# Altium footprint library connector.PcbLib: 39 footprints (part 1 of 3)
Each footprint in its own frame and in the unit in brackets; x right, y up, seen from the top. Pads: shape width x height; smd on the part's side, far side on the other; paste and mask are expansions set on the pad; w line width, h text height; cw(c..) or ccw(c..) is an arc to the next point about the centre after c.
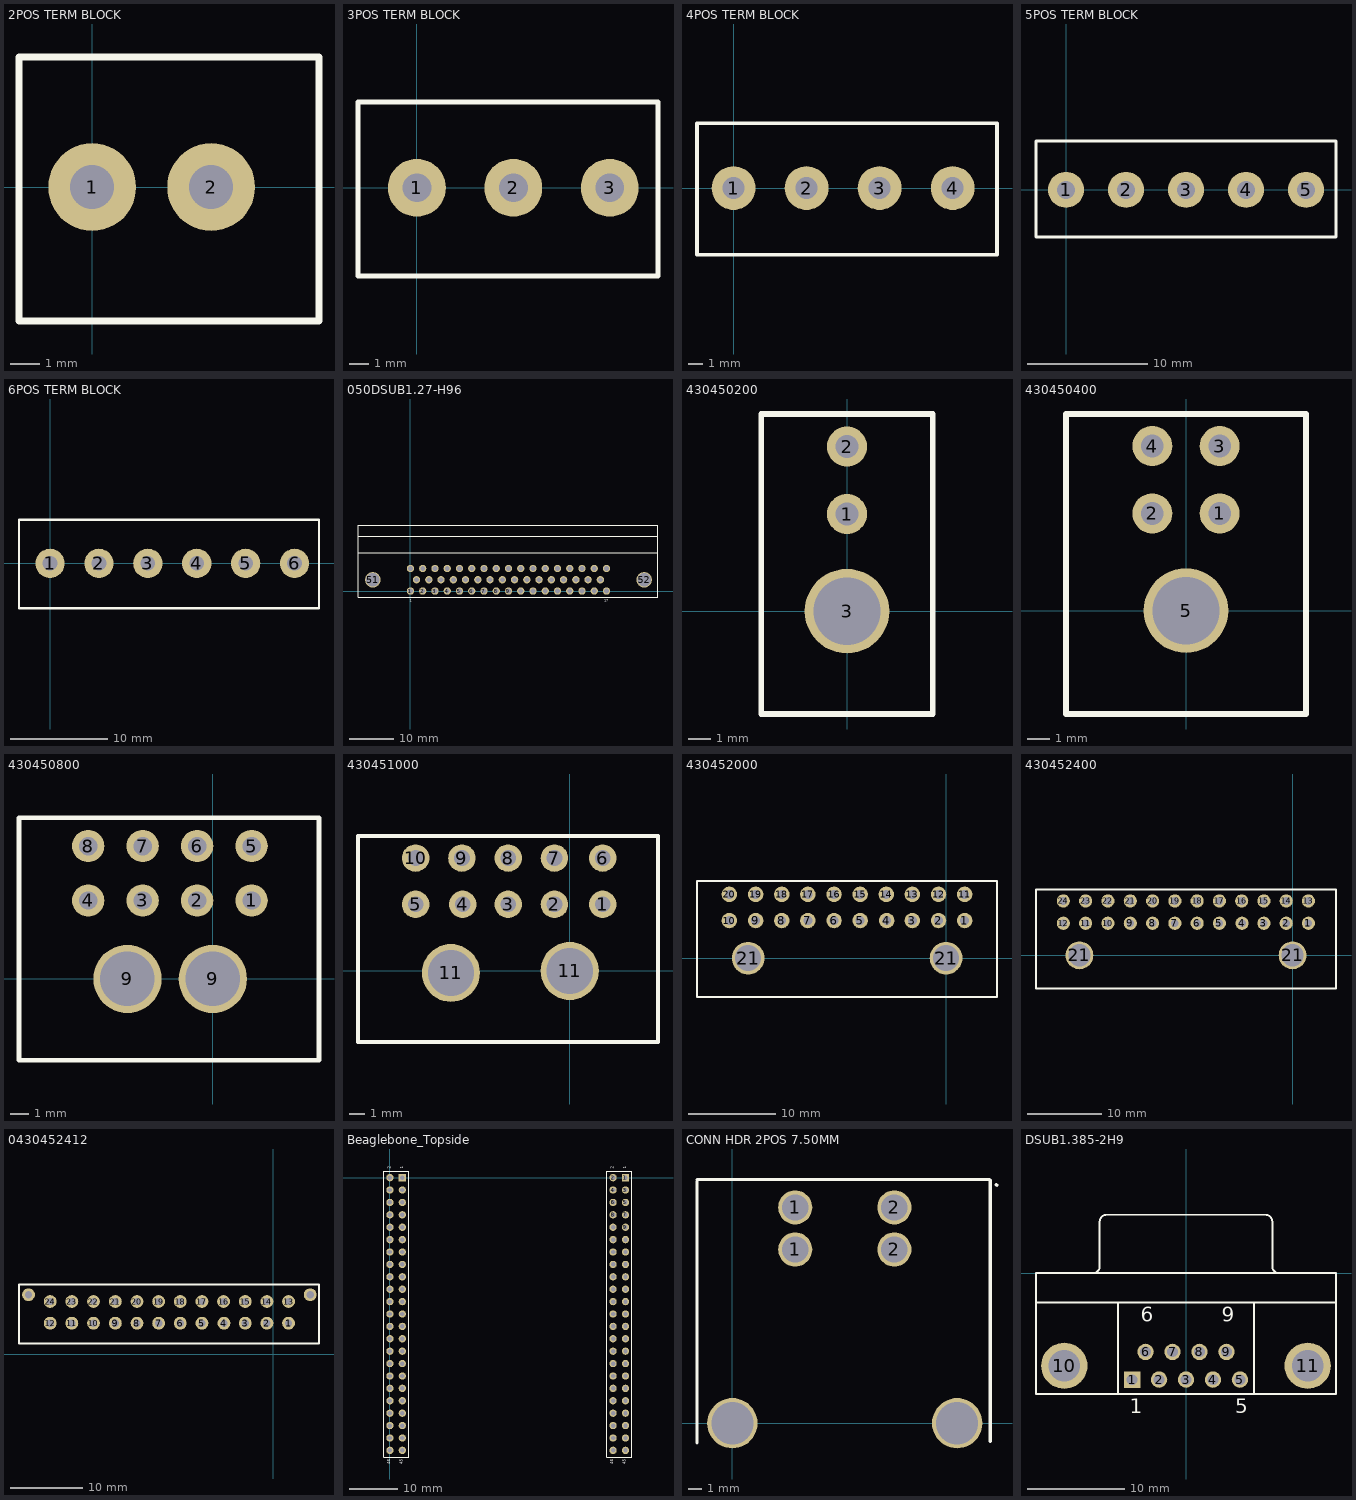
[diagram p0: the footprints below, top view; thin cyan lines are the x and y axes]

## 2POS TERM BLOCK [mm] "5mm Pitch"
height 11.3
pads (2):
  round 3 hole 1.5: 1(0,0) 2(4.064,0)
Top Overlay:
  lines w0.254: -2.5,-4.572 -2.5,4.445 7.747,4.445 7.747,-4.572 -2.5,-4.572
3D body "P3EL-P-001-2PinScrewTerminal-V2-PCBONLY.stp": height 12.6, standoff -4.3, extent -2.506,-4.572 8.094,4.428
3D body: height 0.25, standoff 0, extent 0,0 0,0

## 3POS TERM BLOCK [mm] "5mm Pitch"
height 11.3
pads (3):
  round 3 hole 1.5: 1(0,0) 2(5,0) 3(10,0)
Top Overlay:
  lines w0.254: -3.048,-4.572 12.5,-4.572 12.5,4.445 -3.048,4.445 -3.048,-4.572
3D body "P3EL-P-002-3PinScrewTerminal.prt.stp": height 12.6, standoff -4.3, extent -3.034,-4.572 12.486,4.428

## 4POS TERM BLOCK [mm]
height 11.3
pads (4):
  round 3 hole 1.5: 1(0,0) 2(5,0) 3(10,0) 4(15,0)
Top Overlay:
  lines w0.254: -2.5,-4.572 -2.5,4.445 18.034,4.445 18.034,-4.572 -2.5,-4.572
3D body "P3EL-P-003-4PinScrewTerminal-PCBONLY.stp": height 3.8, standoff -13.1, extent -2.553,-4.555 18.047,4.445

## 5POS TERM BLOCK [mm]
height 11.3
pads (5):
  round 3 hole 1.5: 1(0,0) 2(5,0) 3(10,0) 4(15,0) 5(20,0)
Top Overlay:
  lines w0.254: -2.5,-3.936 -2.5,4.064 22.5,4.064 22.5,-3.936 -2.5,-3.936

## 6POS TERM BLOCK [mm] "5mm"
height 11.3
pads (6):
  round 3 hole 1.5: 1(0,0) 2(5,0) 3(10,0) 4(15,0) 5(20,0) 6(25,0)
Top Overlay:
  lines w0.254: -3.175,-4.572 27.5,-4.572 27.5,4.445 -3.175,4.445 -3.175,-4.572
3D body "P3EL-P-005-6PinScrewTerminal-PCBONLY.prt.stp": height 12.87, standoff -4.03, extent -3.175,-4.563 27.425,4.436

## 050DSUB1.27-H96 [mil] "Connector; D Subminiature; 96 Position; Right Angle; Pitch 1.27 mm"
height 295.28
pads (52):
  round 65 hole 43.31: 1(0,0) 2(108.66,0) 3(217.32,0) 4(325.98,0) 5(434.65,0) 6(543.31,0) 7(651.97,0) 8(760.63,0) 9(869.29,0) 10(977.95,0) 11(1086.61,0) 12(1195.28,0) 13(1303.94,0) 14(1412.6,0) 15(1521.26,0) 16(1629.92,0) 17(1738.58,0) 18(54.33,100) 19(162.97,100) 20(271.6,100) 21(380.24,100) 22(488.87,100) 23(597.51,100) 24(706.14,100) 25(814.78,100) 26(923.41,100) 27(1032.05,100) 28(1140.68,100) 29(1249.32,100) 30(1357.95,100) 31(1466.59,100) 32(1575.22,100) 33(1683.86,100) 34(0,200) 35(108.66,200) 36(217.32,200) 37(325.98,200) 38(434.65,200) 39(543.31,200) 40(651.97,200) 41(760.63,200) 42(869.29,200) 43(977.95,200) 44(1086.61,200) 45(1195.28,200) 46(1303.94,200) 47(1412.6,200) 48(1521.26,200) 49(1629.92,200) 50(1738.58,200)
  round 138 hole 122.05: 51(-333.46,100) 52(2072.05,100)
Top Overlay:
  lines w7.87: -465,-55 2195,-55 ; -465,585 -465,340 2190,340
  lines w10: -465,-55 -465,340 ; -465,485 2195,485 ; -465,585 2195,585 2195,330 2195,-55
  text "17" at 1718.58,-105 h40
  text "1" at -6.42,-105 h40
3D body "0966552X61Y_100706308MOD000B.STP": height 547.24, standoff -122.05, extent -453.9,-42.36 2183.89,817.09

## 430450200 [mil]
pads (3):
  round 70 hole 40: 1(0,170) 2(0,288)
  round 148 hole 118: 3(0,0)
Top Overlay:
  lines w10: -150,-180 150,-180 150,345 -150,345 -150,-180
3D body: height 10, standoff 0, extent 0,0 0,0
3D body "430450200.stp": height 340.35, standoff -130.12, extent -140.75,-185 140.75,296.89

## 430450400 [mil]
pads (5):
  round 70 hole 40: 1(59,170) 2(-59,170) 3(59,288) 4(-59,288)
  round 148 hole 118: 5(0,0)
Top Overlay:
  lines w10: -210,-180.95 210,-180.95 210,344.05 -210,344.05 -210,-180.95
3D body: height 10, standoff 0, extent 0,-0.95 0,-0.95
3D body "430450400.stp": height 340.35, standoff -130.12, extent -199.8,-179.88 199.81,302.01

## 430450800 [mil]
pads (10):
  round 70 hole 40: 1(84,170) 2(-34,170) 3(-152,170) 4(-270,170) 5(84,288) 6(-34,288) 7(-152,288) 8(-270,288)
  round 148 hole 118: 9(-185,0) 9(0,0)
Top Overlay:
  lines w10: -420,-175.95 230,-175.95 230,349.05 -420,349.05 -420,-175.95
3D body "430450800.stp": height 340.35, standoff -130.12, extent -412.91,-179.87 222.92,302.02
3D body: height 10, standoff 0, extent 0,4.05 0,4.05
3D body: height 10, standoff 0, extent -330,-0.95 -330,-0.95

## 430451000 [mil]
pads (12):
  round 70 hole 40: 1(84,170) 2(-39,170) 3(-157,170) 4(-273,170) 5(-393,170) 6(84,288) 7(-39,288) 8(-157,288) 9(-275,288) 10(-393,288)
  round 148 hole 118: 11(-303,-5) 11(0,0)
Top Overlay:
  lines w10: -540,-180.95 -540,344.05 225,344.05 225,-180.95 -540,-180.95
3D body: height 10, standoff 0, extent -325,4.05 -325,4.05
3D body: height 10, standoff 0, extent 5,9.05 5,9.05
3D body "430451000.stp": height 340.35, standoff -130.12, extent -531.96,-179.88 221.98,302.01

## 430452000 [mil]
pads (22):
  round 70 hole 40: 1(84,170) 2(-34,170) 3(-152,170) 4(-268,170) 5(-388,170) 6(-506,170) 7(-624,170) 8(-742,170) 9(-860,170) 10(-979,170) 11(84,288) 12(-34,288) 13(-152,288) 14(-270,288) 15(-388,288) 16(-506,288) 17(-624,288) 18(-742,288) 19(-860,288) 20(-979,288)
  round 148 hole 118: 21(-894,0) 21(0,0)
Top Overlay:
  lines w10: -1125,-175.95 230,-175.95 230,349.05 -1125,349.05 -1125,-175.95
3D body: height 10, standoff 0, extent 0,4.05 0,4.05
3D body: height 10, standoff 0, extent -330,-0.95 -330,-0.95
3D body "430452000.stp": height 340.35, standoff -130.12, extent -1119.49,-175.95 225,305.95

## 430452400 [mil]
pads (26):
  round 70 hole 40: 1(84,170) 2(-34,170) 3(-152,170) 4(-268,170) 5(-388,170) 6(-506,170) 7(-624,170) 8(-742,170) 9(-860,170) 10(-979,170) 11(-1097,170) 12(-1215,170) 13(84,288) 14(-34,288) 15(-152,288) 16(-270,288) 17(-388,288) 18(-506,288) 19(-624,288) 20(-742,288) 21(-860,288) 22(-979,288) 23(-1097,288) 24(-1215,288)
  round 148 hole 118: 21(-1130,0) 21(0,0)
Top Overlay:
  lines w10: -1360,-175.95 -1360,349.05 230,349.05 230,-175.95 -1360,-175.95
3D body: height 10, standoff 0, extent -330,-0.95 -330,-0.95
3D body: height 10, standoff 0, extent 0,4.05 0,4.05
3D body "430452400.stp": height 340.35, standoff -130.12, extent -1350,-175.95 230.71,305.95

## 0430452412 [mil]
pads (26):
  round 70 hole 40: 1(84,170) 2(-34,170) 3(-152,170) 4(-268,170) 5(-388,170) 6(-506,170) 7(-624,170) 8(-742,170) 9(-860,170) 10(-979,170) 11(-1097,170) 12(-1215,170) 13(84,288) 14(-34,288) 15(-152,288) 16(-270,288) 17(-388,288) 18(-506,288) 19(-624,288) 20(-742,288) 21(-860,288) 22(-979,288) 23(-1097,288) 24(-1215,288) ""(-1333,325) ""(202,325)
Top Overlay:
  lines w10: -1385,60 250,60 250,380 -1385,380 -1385,60
3D body "430452412.stp": height 404.88, standoff -110.47, extent -1355.71,72.36 225,417.64
3D body: height 10, standoff 0, extent 0,4.05 0,4.05
3D body: height 10, standoff 0, extent -330,-0.95 -330,-0.95

## Beaglebone_Topside [mm] "Connector; Header; 24x2 Position"
pads (92):
  rect 1.5x1.5 hole 0.9: 1(48.26,0) 101(2.54,0)
  round 1.5 hole 0.9: 2(45.72,0) 3(48.26,-2.54) 4(45.72,-2.54) 5(48.26,-5.08) 6(45.72,-5.08) 7(48.26,-7.62) 8(45.72,-7.62) 9(48.26,-10.16) 10(45.72,-10.16) 11(48.26,-12.7) 12(45.72,-12.7) 13(48.26,-15.24) 14(45.72,-15.24) 15(48.26,-17.78) 16(45.72,-17.78) 17(48.26,-20.32) 18(45.72,-20.32) 19(48.26,-22.86) 20(45.72,-22.86) 21(48.26,-25.4) 22(45.72,-25.4) 23(48.26,-27.94) 24(45.72,-27.94) 25(48.26,-30.48) 26(45.72,-30.48) 27(48.26,-33.02) 28(45.72,-33.02) 29(48.26,-35.56) 30(45.72,-35.56) 31(48.26,-38.1) 32(45.72,-38.1) 33(48.26,-40.64) 34(45.72,-40.64) 35(48.26,-43.18) 36(45.72,-43.18) 37(48.26,-45.72) 38(45.72,-45.72) 39(48.26,-48.26) 40(45.72,-48.26) 41(48.26,-50.8) 42(45.72,-50.8) 43(48.26,-53.34) 44(45.72,-53.34) 45(48.26,-55.88) 46(45.72,-55.88) 102(0,0) 103(2.54,-2.54) 104(0,-2.54) 105(2.54,-5.08) 106(0,-5.08) 107(2.54,-7.62) 108(0,-7.62) 109(2.54,-10.16) 110(0,-10.16) 111(2.54,-12.7) 112(0,-12.7) 113(2.54,-15.24) 114(0,-15.24) 115(2.54,-17.78) 116(0,-17.78) 117(2.54,-20.32) 118(0,-20.32) 119(2.54,-22.86) 120(0,-22.86) 121(2.54,-25.4) 122(0,-25.4) 123(2.54,-27.94) 124(0,-27.94) 125(2.54,-30.48) 126(0,-30.48) 127(2.54,-33.02) 128(0,-33.02) 129(2.54,-35.56) 130(0,-35.56) 131(2.54,-38.1) 132(0,-38.1) 133(2.54,-40.64) 134(0,-40.64) 135(2.54,-43.18) 136(0,-43.18) 137(2.54,-45.72) 138(0,-45.72) 139(2.54,-48.26) 140(0,-48.26) 141(2.54,-50.8) 142(0,-50.8) 143(2.54,-53.34) 144(0,-53.34) 145(2.54,-55.88) 146(0,-55.88)
Top Overlay:
  lines w0.2: -1.27,-57.277 3.81,-57.277 3.81,1.27 -1.27,1.27 -1.27,-57.277 ; 44.45,-57.277 44.45,1.27 49.53,1.27 49.53,-57.277 44.45,-57.277
  text "2" at 46.101,1.778 h1.02
  text "1" at 48.641,1.778 h1.02
  text "46" at 45.974,-58.674 h1.02
  text "45" at 48.514,-58.674 h1.02
  text "45" at 2.794,-58.674 h1.02
  text "46" at 0.254,-58.674 h1.02
  text "1" at 2.921,1.778 h1.02
  text "2" at 0.381,1.778 h1.02
3D body "BeagleBone Black.SLDPRT": height 15.24, standoff 0.63, extent -3.32,-65.278 51.29,23.622

## CONN HDR 2POS 7.50MM [mm]
pads (6):
  round 2.58 hole 1.98: 1(4.75,13.13) 1(4.75,16.31) 2(12.243,13.13) 2(12.243,16.31)
  round 3.81 hole 3.175: ""(0,0) ""(16.993,0)
Top Overlay:
  lines w0.254: -2.669,-1.492 -2.669,18.288 ; -2.667,18.415 19.431,18.415 ; 19.492,-1.365 19.492,18.354 ; 19.939,18.034 20,17.973
3D body "431605302.stp": height 15.12, standoff -3.6, extent -2.286,-3.048 18.796,16.739

## DSUB1.385-2H9 [mm] "Connector; D Subminiature; 9 Position; Right Angle; Pitch 1.385 mm"
height 12.75
pads (11):
  rect 1.69x1.69 hole 1.09: 1(-5.54,-10.92)
  round 1.69 hole 1.09: 2(-2.77,-10.92) 3(0,-10.92) 4(2.77,-10.92) 5(5.54,-10.92) 6(-4.155,-8.08) 7(-1.385,-8.08) 8(1.385,-8.08) 9(4.155,-8.08)
  round 4.76 hole 3.26: 10(-12.495,-9.5) 11(12.495,-9.5)
Top Overlay:
  lines w0.2: -15.4,-3 15.4,-3 ; -9.56,0.005 ccw(c-9.56,0.7) -8.865,0.7 -8.865,5.3 ; -8.86,5.305 cw(c-8.165,5.305) -8.165,6 8.165,6 cw(c8.165,5.305) 8.86,5.305 ; -7,-12.4 -7,-3 ; 7,-12.4 7,-3 ; 8.865,5.3 8.865,0.7 ccw(c9.56,0.7) 9.56,0.005 ; -15.4,-12.4 15.4,-12.4 15.4,0 -15.4,0 -15.4,-12.4
  text "6" at -4.655,-4.975 h1.5
  text "9" at 3.655,-4.975 h1.5
  text "5" at 5.04,-14.375 h1.5
  text "1" at -5.79,-14.375 h1.5
3D body "User Library-D-SUB 9P RA Male.STEP": height 12.55, standoff -3.9, extent -15.433,-12.374 15.367,6.223